# Altium footprint library ICL_komponenty_v1.PcbLib: 160 footprints (part 1 of 10)
Each footprint in its own frame and in the unit in brackets; x right, y up, seen from the top. Pads: shape width x height; smd on the part's side, far side on the other; paste and mask are expansions set on the pad; w line width, h text height; cw(c..) or ccw(c..) is an arc to the next point about the centre after c.
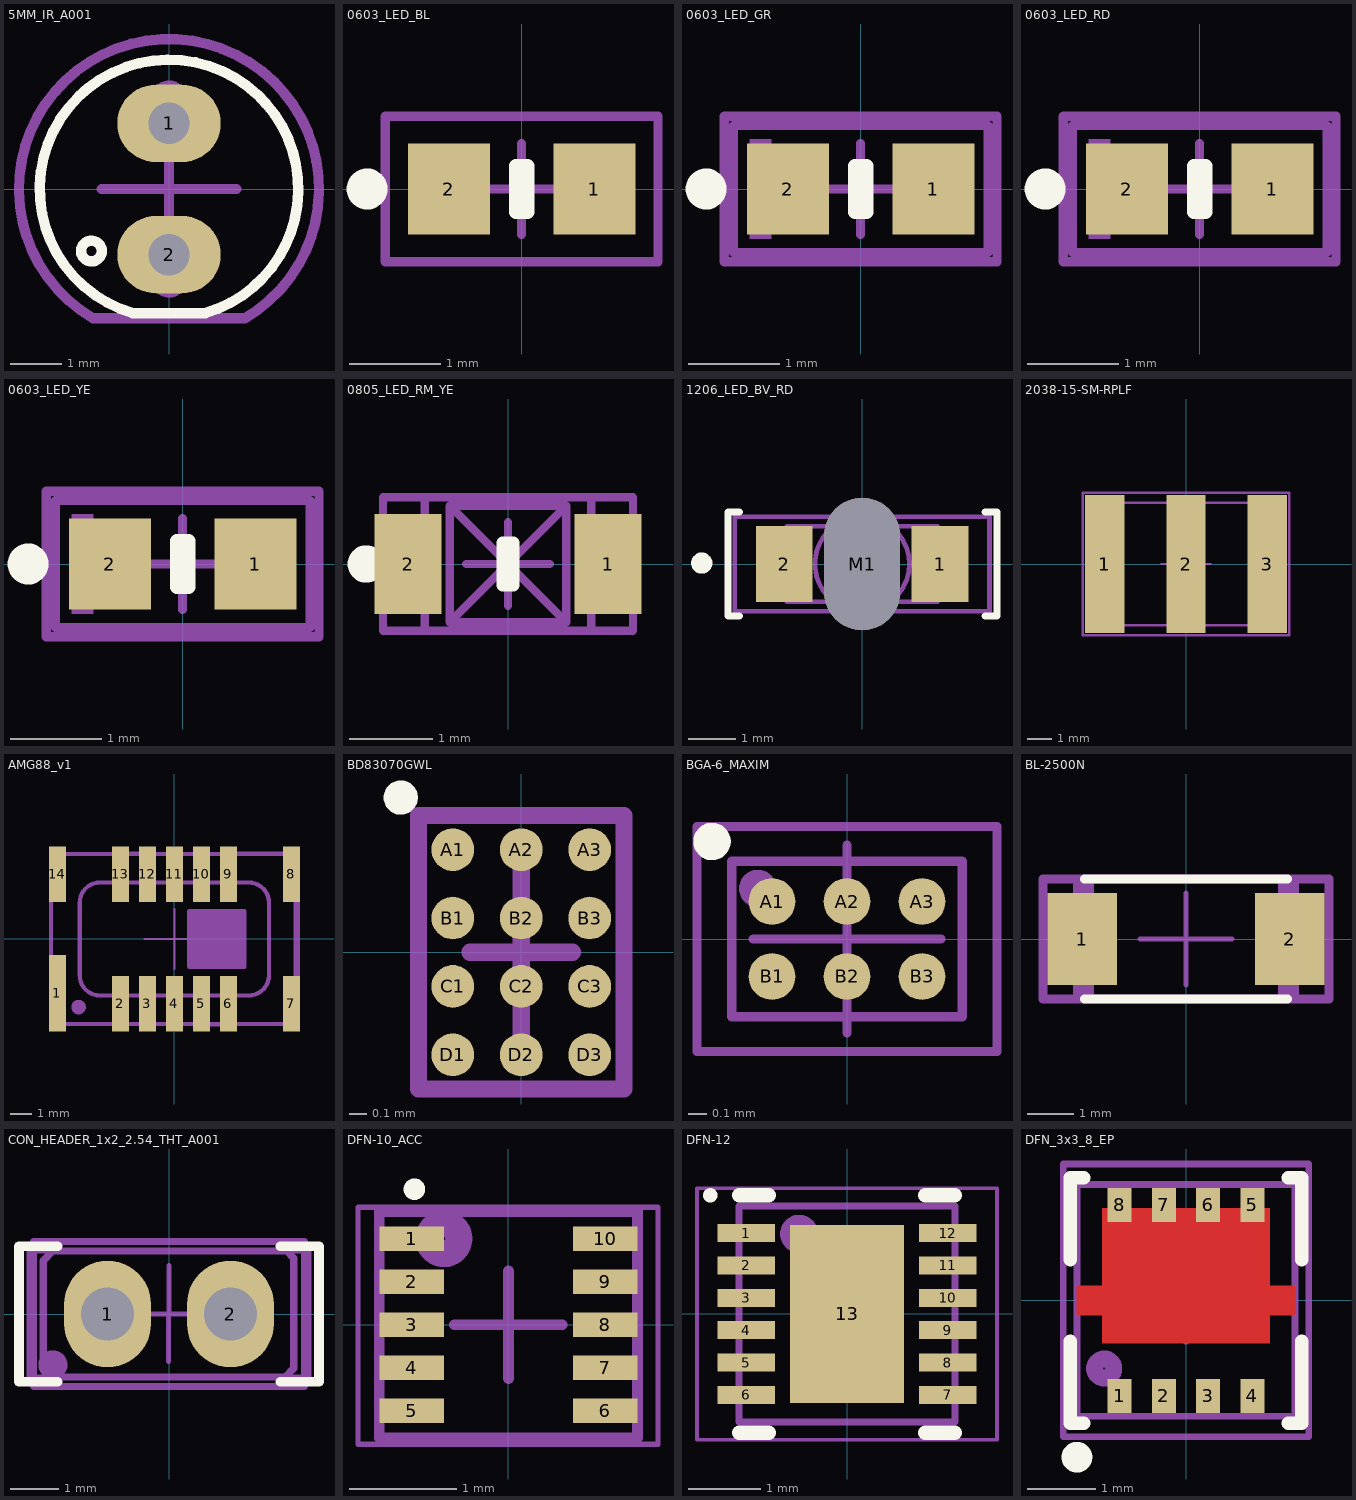
[diagram p0: the footprints below, top view; thin cyan lines are the x and y axes]

## 5MM_IR_A001 [mm]
pads (2):
  oval 2x1.5 hole 0.8: 1(0,1.27) 2(0,-1.27)
Top Overlay:
  circle w0.2: c-1.5,-1.2 r0.2
  lines w0.2: -0.7,-2.4 cw(c0,0) 1.5,2 cw(c0,0) 0.7,-2.4 -0.7,-2.4
Top M17-18_TDES:
  text "'.Designator'" at -4.865,3.283 h1
Top M19-20_TMOT:
  circle w0.3: c0,1.75 r0.2
  circle w0.3: c0,-1.75 r0.2
  lines w0.2: 1.461,-2.505 ccw(c0,0) -1.47,-2.5 1.461,-2.5
Top M25-26_TORG:
  lines w0.2: -1.3,0 0,0 ; 0,-1.3 0,0 ; 0,1.3 0,0 ; 1.3,0 0,0
3D body "TSAL6100.stp": height 11.91, standoff -2.2, extent -2.9,-2.5 2.9,2.9

## 0603_LED_BL [mm] "0603 LED Blue"
height 0.381
pads (2):
  rect 0.9x1 smd: 1(0.8,0) 2(-0.8,0)
Top Overlay:
  circle w0.25: c-1.7,0 r0.1
  lines w0.152: -0.064,-0.254 -0.064,0.254 0.064,0.254 0.064,-0.254 -0.064,-0.254
Top M11-12_SMOT:
  lines w0.1: -1.5,-0.8 1.5,-0.8 1.5,0.8 -1.5,0.8 -1.5,-0.8
Top M13-14_SDES:
  text "'.Designator'" at -2.832,-0.208 h0.5
Top M15-16_SORG:
  lines w0.1: -0.5,0 0.5,0 ; 0,-0.5 0,0.5 ; -1.5,-0.8 1.5,-0.8 1.5,0.8 -1.5,0.8 -1.5,-0.8

## 0603_LED_GR [mm] "0603 LED Green"
height 0.381
pads (2):
  rect 0.9x1 smd: 1(0.8,0) 2(-0.8,0)
Top Overlay:
  circle w0.25: c-1.7,0 r0.1
  lines w0.152: -0.064,-0.254 0.064,-0.254 0.064,0.254 -0.064,0.254 -0.064,-0.254
Top M11-12_SMOT:
  rectangle: -1.22,-0.55 -0.983,0.549
  lines w0.1: -1.4,-0.7 1.4,-0.7 1.4,0.7 -1.4,0.7 -1.4,-0.7
Top M13-14_SDES:
  text "'.Designator'" at -2.832,-0.208 h0.5
Top M15-16_SORG:
  lines w0.1: -0.5,0 0.5,0 ; 0,-0.5 0,0.5 ; -1.5,-0.8 1.5,-0.8 1.5,0.8 -1.5,0.8 -1.5,-0.8
3D body "LED_0603_G.STEP": height 0.61, standoff 0.01, extent -0.8,-0.4 0.8,0.4

## 0603_LED_RD [mm] "0603 LED Red"
height 0.381
pads (2):
  rect 0.9x1 smd: 1(0.8,0) 2(-0.8,0)
Top Overlay:
  circle w0.25: c-1.7,0 r0.1
  lines w0.152: -0.064,-0.254 -0.064,0.254 0.064,0.254 0.064,-0.254 -0.064,-0.254
Top M11-12_SMOT:
  rectangle: -1.22,-0.55 -0.983,0.549
  lines w0.1: -1.4,-0.7 1.4,-0.7 1.4,0.7 -1.4,0.7 -1.4,-0.7
Top M13-14_SDES:
  text "'.Designator'" at -2.832,-0.208 h0.5
Top M15-16_SORG:
  lines w0.1: -0.5,0 0.5,0 ; 0,-0.5 0,0.5 ; -1.5,-0.8 1.5,-0.8 1.5,0.8 -1.5,0.8 -1.5,-0.8
3D body "led_0603_red.STEP": height 0.71, standoff 0.01, extent -0.8,-0.4 0.8,0.4

## 0603_LED_YE [mm] "0603 LED Yellow"
height 0.381
pads (2):
  rect 0.9x1 smd: 1(0.8,0) 2(-0.8,0)
Top Overlay:
  circle w0.25: c-1.7,0 r0.1
  lines w0.152: -0.064,-0.254 -0.064,0.254 0.064,0.254 0.064,-0.254 -0.064,-0.254
Top M11-12_SMOT:
  rectangle: -1.22,-0.55 -0.983,0.549
  lines w0.1: -1.4,-0.7 1.4,-0.7 1.4,0.7 -1.4,0.7 -1.4,-0.7
Top M13-14_SDES:
  text "'.Designator'" at -2.832,-0.208 h0.5
Top M15-16_SORG:
  lines w0.1: -0.5,0 0.5,0 ; 0,-0.5 0,0.5 ; -1.5,-0.8 1.5,-0.8 1.5,0.8 -1.5,0.8 -1.5,-0.8
3D body "LED_0603_Y.STEP": height 0.61, standoff 0.01, extent -0.8,-0.4 0.8,0.4

## 0805_LED_RM_YE [mm] "0805 LED Yellow rewerse mount"
height 0.381
pads (2):
  rect 0.8x1.2 smd: 1(1.2,0) 2(-1.2,0)
Top Overlay:
  circle w0.25: c-1.7,0 r0.1
  lines w0.152: -0.064,-0.254 0.064,-0.254 0.064,0.254 -0.064,0.254 -0.064,-0.254
Top M11-12_SMOT:
  rectangle: -1.22,-0.55 -0.983,0.549
  lines w0.1: -1.5,-0.8 -1.5,0.8 1.5,0.8 1.5,-0.8 -1.5,-0.8
Top M13-14_SDES:
  text "'.Designator'" at -2.832,-0.208 h0.5
Top M15-16_SORG:
  lines w0.1: -0.5,0 0.5,0 ; 0,-0.5 0,0.5 ; -1.5,-0.8 -1.5,0.8 1.5,0.8 1.5,-0.8 -1.5,-0.8
Bottom M15-16_SORG:
  lines w0.1: -1,-0.8 -1,0.8 ; 1,-0.8 1,0.8 ; -0.7,-0.7 -0.7,0.7 ; -0.7,-0.7 0.7,-0.7 ; -0.7,-0.7 0.7,0.7 ; -0.7,0.7 0.7,0.7 ; -0.7,0.7 0.7,-0.7 ; 0.7,-0.7 0.7,0.7
3D body "led_0805_yellow.step": height 0.52, standoff -0.58, extent -1,-0.625 1.02,0.625

## 1206_LED_BV_RD [mm] "1206 LED Red bottom viev"
height 0.381
pads (3):
  rect 1.2x1.6 smd: 1(1.65,0) 2(-1.65,0)
  oval 1.6x2.8 hole 1.6 slot 2.8 at 90 deg unplated mask+0: M1(0,0)
Top Overlay:
  circle w0.25: c-3.399,0.019 r0.1
  lines w0.152: -2.6,-1.1 -2.845,-1.1 -2.845,1.1 -2.6,1.1 ; 2.6,-1.1 2.857,-1.1 2.857,1.1 2.6,1.1
Top M11-12_SMOT:
  rectangle: -1.337,-0.6 -1.1,0.579
  rectangle: -2.1,-0.8 -1.6,0.8
  region: 2.1,0.8 1.6,0.8 1.6,-0.8 2.1,-0.8
  lines w0.1: -1.6,-0.8 -1.6,0.8 1.6,0.8 1.6,-0.8 -1.6,-0.8
Top M13-14_SDES:
  text "'.Designator'" at -2.832,1.792 h0.5
Top M15-16_SORG:
  circle w0.1: c0,0 r1
  lines w0.1: -0.5,0 0.5,0 ; 0,-0.5 0,0.5 ; -2.7,-1 -2.7,1 2.7,1 2.7,-1 -2.7,-1
3D body "156125RS57000_LED_RD_BV_1205.stp": height 0.29, standoff -0.81, extent -1.6,-0.6 1.6,0.6

## 2038-15-SM-RPLF [mm] "GDT  BOURNS"
pads (3):
  rect 1.6x5.6 smd mask+0: 1(-3.3,0) 2(0,0) 3(3.3,0)
Top M11-12_SMOT:
  rectangle: -3.9,-2.5 -3.3,2.5
  region: 3.9,2.5 3.3,2.5 3.3,-2.5 3.9,-2.5
  rectangle: -0.7,-2.5 0.7,2.5
  lines w0.1: -3.9,-2.5 3.9,-2.5 3.9,2.5 -3.9,2.5 -3.9,-2.5
Top M13-14_SDES:
  text "'.Designator'" at -2.832,-0.208 h0.5
Top M15-16_SORG:
  lines w0.1: -1,0 1,0 ; 0,-1 0,1 ; -4.2,-2.9 -4.2,2.9 4.2,2.9 4.2,-2.9 -4.2,-2.9
3D body "2038-xx-sm.stp": height 5.01, standoff 0.01, extent -3.75,-2.5 3.75,2.5

## AMG88_v1 [mm]
pads (14):
  rect 0.8x3.6 smd: 1(-5.5,-2.55)
  rect 0.8x2.6 smd: 2(-2.54,-3.05) 3(-1.27,-3.05) 4(0,-3.05) 5(1.27,-3.05) 6(2.54,-3.05) 7(5.5,-3.05) 8(5.5,3.05) 9(2.54,3.05) 10(1.27,3.05) 11(0,3.05) 12(-1.27,3.05) 13(-2.54,3.05) 14(-5.5,3.05)
Top M11-12_SMOT:
  drawing of 52 lines, arcs and shapes, not listed
Top M13-14_SDES:
  text "'.Designator'" at -7.815,-0.367 h1
Top M15-16_SORG:
  lines w0.1: -1.4,0 0,0 ; 0,-1.4 0,0 ; 0,1.4 0,0 ; 2,-1.3 2,1.3 ; 3.3,0 1.4,0 0,0
  lines w0.2: -5.8,-4 -5.8,4 5.8,4 5.8,-4 -5.8,-4 ; 0.7,-1.3 0.7,1.3 3.3,1.3 3.3,-1.3 0.7,-1.3
3D body "AMG88-1.STEP": height 4.31, standoff 0.01, extent -5.8,-4 5.8,4

## BD83070GWL [mm] "BGA"
pads (12):
  round 0.25 smd paste-0.15 mask+0.04: A1(-0.4,0.6) A2(0,0.6) A3(0.4,0.6) B1(-0.4,0.2) B2(0,0.2) B3(0.4,0.2) C1(-0.4,-0.2) C2(0,-0.2) C3(0.4,-0.2) D1(-0.4,-0.6) D2(0,-0.6) D3(0.4,-0.6)
Top Overlay:
  circle w0.1: c-0.705,0.905 r0.05
Top M11-12_SMOT:
  lines w0.1: -0.6,-0.8 0.6,-0.8 0.6,0.8 -0.6,0.8 -0.6,-0.8
Top M13-14_SDES:
  text "'.Designator'" at -2.266,1.333 h0.4
Top M15-16_SORG:
  lines w0.1: -0.3,0 0,0 ; 0,-0.6 0,0 ; 0,0.6 0,0 ; 0.3,0 0,0
3D body "bd8307_3.step": height 0.57, standoff 0, extent -0.6,-0.8 0.6,0.8

## BGA-6_MAXIM [mm]
height 0.3
pads (6):
  round 0.25 smd mask+0.05: A1(-0.4,0.2) A2(0,0.2) A3(0.4,0.2) B1(-0.4,-0.2) B2(0,-0.2) B3(0.4,-0.2)
Top Overlay:
  circle w0.1: c-0.72,0.52 r0.05
Top Solder:
  rectangle: -0.5,-0.199 0.5,0.199
  lines w0.2: -0.4,-0.2 0.4,-0.2 ; -0.4,0.2 0.4,0.2
Top M11-12_SMOT:
  circle w0.1: c-0.476,0.269 r0.05
  lines w0.05: -0.615,-0.415 0.615,-0.415 0.615,0.415 -0.615,0.415 -0.615,-0.415
Top M13-14_SDES:
  text "'.Designator'" at -2.266,0.533 h0.4
Top M15-16_SORG:
  lines w0.05: -0.5,0 0.5,0 ; 0,-0.5 0,0.5 ; -0.8,-0.6 -0.8,0.6 0.8,0.6 0.8,-0.6 -0.8,-0.6
3D body "BGA-6_MAXIM.step": height 0.3, standoff 0, extent -0.615,-0.415 0.615,0.415

## BL-2500N [mm] "vibration sensor"
pads (2):
  rect 1.5x2 smd: 1(-2.25,0) 2(2.25,0)
Top Overlay:
  lines w0.2: -2.2,-1.3 2.2,-1.3 ; -2.2,1.3 2.2,1.3
Top M11-12_SMOT:
  rectangle: 1.998,-1.3 2.4,1.3
  region: -1.998,1.3 -2.4,1.3 -2.4,-1.3 -1.998,-1.3
  lines w0.1: -2.4,-1.3 2.4,-1.3 2.4,1.3 -2.4,1.3 -2.4,-1.3
Top M13-14_SDES:
  text "'.Designator'" at -4.532,-0.333 h0.8
Top M15-16_SORG:
  lines w0.1: -1,0 0,0 ; 0,-1 0,0 ; 0,1 0,0 ; 1,0 0,0
  lines w0.2: -3.1,-1.3 -3.1,1.3 3.1,1.3 3.1,-1.3 -3.1,-1.3
3D body "BL-2500N.stp": height 2.5, standoff 0, extent -2.4,-1.25 2.4,1.25

## CON_HEADER_1x2_2.54_THT_A001 [mm]
pads (2):
  oval 1.8x2.2 hole 1.1 unplated paste-1: 1(-1.27,0) 2(1.27,0)
Top Overlay:
  lines w0.2: -2.3,-1.4 -3.1,-1.4 -3.1,1.4 -2.3,1.4 ; 2.3,-1.4 3.1,-1.4 3.1,1.4 2.3,1.4
Top M15-16_SORG:
  lines w0.1: -1,0 0,0 0,1 ; -0.01,-0.986 -0.01,0.014 ; -0.01,0 0.99,0 ; -2.9,-1.3 -2.9,1.3 2.9,1.3 2.9,-1.3 -2.9,-1.3
Top M17-18_TDES:
  text "'.Designator'" at -5.665,2.083 h1
Top M19-20_TMOT:
  circle w0.3: c-2.4,-1.05 r0.15
  lines w0.15: -2.8,-1.5 -2.8,1.5 2.8,1.5 2.8,-1.5 -2.8,-1.5 ; -2.6,-1.078 -2.378,-1.3 2.4,-1.3 2.579,-1.121 2.579,1.154 2.433,1.3 -2.4,1.3 -2.6,1.1 -2.6,-1.078
3D body "61300211821_CON_1x2_2_54mm.stp": height 8.51, standoff -3.1, extent -2.79,-1.25 2.79,1.25

## DFN-10_ACC [mm] "PQFN, 10-Leads, Body 2,00x2,00mm, Pitch 0,40mm, Thermal Pad 0,50x0,50mm, IPC Medium Density"
height 1
pads (10):
  rect 0.6x0.225 smd: 1(-0.9,0.8) 2(-0.9,0.4) 3(-0.9,0) 4(-0.9,-0.4) 5(-0.9,-0.8) 6(0.9,-0.8) 7(0.9,-0.4) 8(0.9,0) 9(0.9,0.4) 10(0.9,0.8)
Top Overlay:
  circle w0.1: c-0.873,1.26 r0.05
Top M11-12_SMOT:
  circle w0.25: c-0.6,0.8 r0.14
  region: -1.2,0.886 -1.2,0.715 -0.95,0.715 -0.95,0.886
  region: -1.2,0.486 -1.2,0.315 -0.756,0.315 -0.756,0.486
  region: -1.2,0.086 -1.2,-0.085 -0.756,-0.085 -0.756,0.086
  region: -1.2,-0.314 -1.2,-0.485 -0.756,-0.485 -0.756,-0.314
  region: -1.2,-0.714 -1.2,-0.885 -0.756,-0.885 -0.756,-0.714
  region: 1.2,-0.886 1.2,-0.715 0.756,-0.715 0.756,-0.886
  region: 1.2,-0.486 1.2,-0.315 0.756,-0.315 0.756,-0.486
  region: 1.2,-0.086 1.2,0.085 0.756,0.085 0.756,-0.086
  region: 1.2,0.314 1.2,0.485 0.756,0.485 0.756,0.314
  region: 1.2,0.714 1.2,0.885 0.756,0.885 0.756,0.714
  lines w0.1: -1.2,-1.05 1.2,-1.05 1.2,1.05 -1.2,1.05 -1.2,-1.05
Top M13-14_SDES:
  text "'.Designator'" at -3.915,-0.292 h0.7
Top M15-16_SORG:
  lines w0.05: -1.398,-1.111 -1.398,1.09 1.391,1.09 1.391,-1.111 -1.398,-1.111
  lines w0.1: -0.5,0 0.5,0 ; 0,-0.5 0,0.5
3D body "DFN-10_ACC.step": height 1, standoff 0, extent -1,-1 1,1

## DFN-12 [mm] "FTDI DFN-12"
height 0.9
pads (13):
  rect 0.8x0.25 smd: 1(-1.4,1.125) 2(-1.4,0.675) 3(-1.4,0.225) 4(-1.4,-0.225) 5(-1.4,-0.675) 6(-1.4,-1.125) 7(1.4,-1.125) 8(1.4,-0.675) 9(1.4,-0.225) 10(1.4,0.225) 11(1.4,0.675) 12(1.4,1.125)
  rect 1.58x2.48 smd: 13(0,0)
Top Overlay:
  circle w0.1: c-1.9,1.65 r0.05
  lines w0.2: -1.5,-1.65 -1.09,-1.65 ; -1.5,1.65 -1.09,1.65 ; 1.09,-1.65 1.5,-1.65 ; 1.09,1.65 1.5,1.65
Top M11-12_SMOT:
  circle w0.25: c-0.665,1.114 r0.14
  region: 1.545,1.014 1.545,1.234 1.035,1.234 1.035,1.014
  region: 1.545,0.564 1.545,0.784 1.035,0.784 1.035,0.564
  region: 1.545,0.114 1.545,0.334 1.035,0.334 1.035,0.114
  region: 1.545,-0.336 1.545,-0.116 1.035,-0.116 1.035,-0.336
  region: 1.545,-0.786 1.545,-0.566 1.035,-0.566 1.035,-0.786
  region: 1.545,-1.236 1.545,-1.016 1.035,-1.016 1.035,-1.236
  region: -1.545,0.336 -1.545,0.116 -1.035,0.116 -1.035,0.336
  region: -1.545,0.786 -1.545,0.566 -1.035,0.566 -1.035,0.786
  region: -1.545,1.236 -1.545,1.016 -1.035,1.016 -1.035,1.236
  region: -1.545,-1.014 -1.545,-1.234 -1.035,-1.234 -1.035,-1.014
  region: -1.545,-0.564 -1.545,-0.784 -1.035,-0.784 -1.035,-0.564
  region: -1.545,-0.114 -1.545,-0.334 -1.035,-0.334 -1.035,-0.114
  lines w0.1: -1.5,-1.5 1.5,-1.5 1.5,1.5 -1.5,1.5 -1.5,-1.5
Top M13-14_SDES:
  text "'.Designator'" at 0.333,-4.532 h0.8
Top M15-16_SORG:
  lines w0.05: -2.085,-1.75 -2.085,1.75 2.085,1.75 2.085,-1.75 -2.085,-1.75
  lines w0.1: -0.5,0 0.5,0 ; 0,-0.5 0,0.5
3D body "DFN-12.step": height 0.9, standoff 0, extent -1.501,-1.5 1.501,1.5

## DFN_3x3_8_EP [mm]
pads (8):
  rect 0.35x0.5 smd mask+0.1: 1(-0.975,-1.4) 2(-0.325,-1.4) 3(0.325,-1.4) 4(0.975,-1.4) 5(0.975,1.4) 6(0.325,1.4) 7(-0.325,1.4) 8(-0.975,1.4)
Top Layer:
  region: -1.6,-0.215 -1.6,0.215 -1.225,0.215 -1.225,1.35 1.225,1.35 1.225,0.215 1.6,0.215 1.6,-0.215 1.225,-0.215 1.225,-0.63 -1.225,-0.63 -1.225,-0.215
Top Overlay:
  circle w0.25: c-1.6,-2.3 r0.1
  lines w0.2: -1.7,-0.6 -1.7,-1.8 -1.5,-1.8 ; -1.7,0.6 -1.7,1.8 -1.5,1.8 ; 1.5,-1.8 1.7,-1.8 1.7,-0.6 ; 1.5,1.8 1.7,1.8 1.7,0.6
Top M11-12_SMOT:
  circle w0.25: c-1.2,-1 r0.14
  region: 1.123,1.7 0.821,1.7 0.821,1.2 1.123,1.2
  region: 0.473,1.7 0.171,1.7 0.171,1.2 0.473,1.2
  rectangle: 0.827,-1.7 1.129,-1.2
  rectangle: 0.177,-1.7 0.479,-1.2
  region: -0.177,1.7 -0.479,1.7 -0.479,1.2 -0.177,1.2
  region: -0.827,1.7 -1.129,1.7 -1.129,1.2 -0.827,1.2
  rectangle: -0.473,-1.7 -0.171,-1.2
  rectangle: -1.123,-1.7 -0.821,-1.3
  lines w0.1: -1.6,-1.7 1.6,-1.7 1.6,1.7 -1.6,1.7 -1.6,-1.7
Top M13-14_SDES:
  text "'.Designator'" at -4.532,-0.333 h0.8
Top M15-16_SORG:
  lines w0.1: -0.6,0 0,0 ; 0,-0.6 0,0 ; 0,0.6 0,0 ; 0.6,0 0,0 ; -1.8,-2 1.8,-2 1.8,2 -1.8,2 -1.8,-2
3D body "DFN_3x3_8L_EP2_P.STEP": height 0.82, standoff 0.01, extent -1.55,-1.6 1.55,1.6